# Altium footprint library komponenty_ITS_v1.PcbLib: 81 footprints (part 4 of 6)
Each footprint in its own frame and in the unit in brackets; x right, y up, seen from the top. Pads: shape width x height; smd on the part's side, far side on the other; paste and mask are expansions set on the pad; w line width, h text height; cw(c..) or ccw(c..) is an arc to the next point about the centre after c.
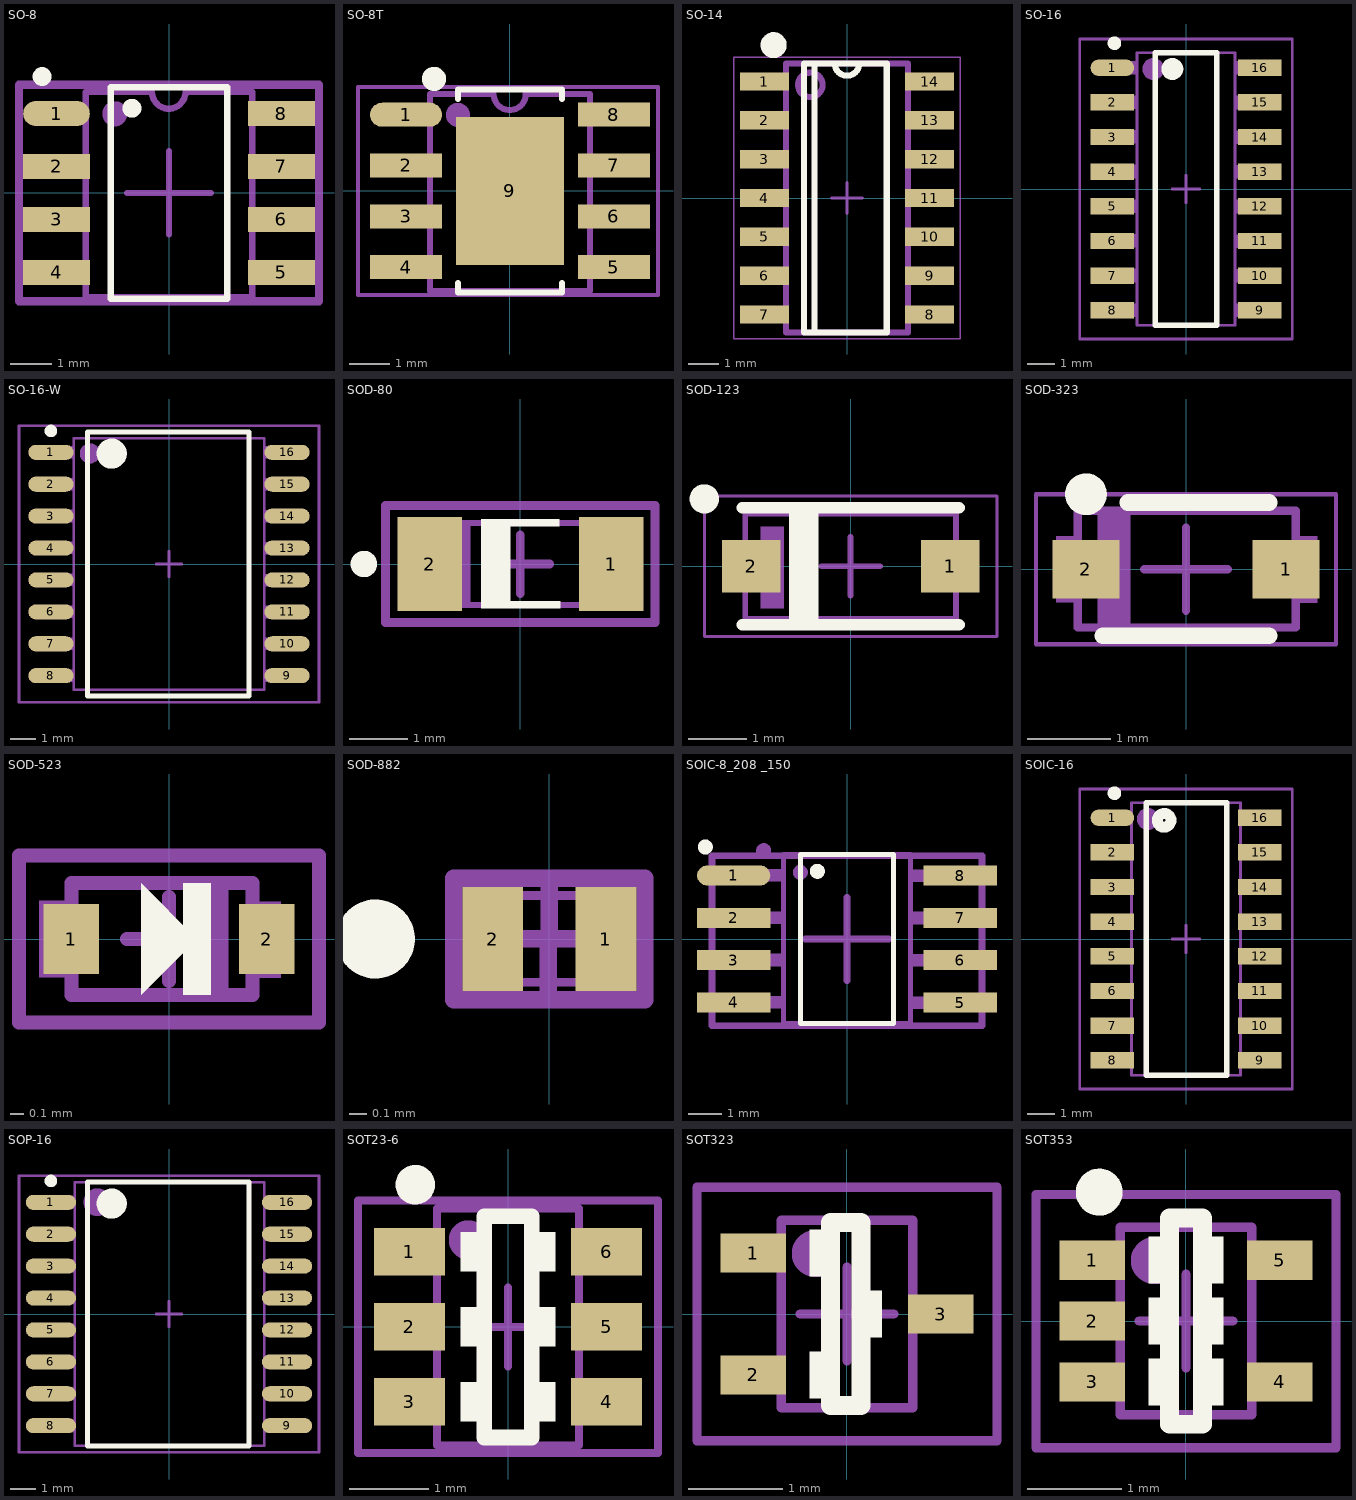
[diagram p3: the footprints below, top view; thin cyan lines are the x and y axes]

## SO-8 [mm]
pads (8):
  oval 1.6x0.6 smd: 1(-2.7,1.905)
  rect 1.6x0.6 smd: 2(-2.7,0.635) 3(-2.7,-0.635) 4(-2.7,-1.905) 5(2.7,-1.905) 6(2.7,-0.635) 7(2.7,0.635) 8(2.7,1.905)
Top Overlay:
  circle w0.25: c-0.889,2.032 r0.1
  circle w0.25: c-3.048,2.794 r0.1
  lines w0.152: -1.397,-2.54 -1.397,2.54 1.397,2.54 1.397,-2.54 -1.397,-2.54
Top M11-12_SMOT:
  circle w0.3: c-1.3,1.9 r0.15
  rectangle: -2.8,-0.834 -2,-0.433
  rectangle: -2.8,0.433 -2,0.833
  region: 2.8,-0.444 2,-0.444 2,-0.845 2.8,-0.845
  region: 2.8,0.856 2,0.856 2,0.455 2.8,0.455
  rectangle: -2.8,-2.1 -2,-1.699
  rectangle: -2.8,1.644 -2,2.144
  region: 2.8,-1.733 2,-1.733 2,-2.133 2.8,-2.133
  region: 2.8,2.112 2,2.112 2,1.71 2.8,1.71
  lines w0.15: -2,-2.5 -2,2.42 -0.407,2.42 ccw(c-0.007,2.42) 0.393,2.42 2,2.42 2,-2.5 -2,-2.5
Top M13-14_SDES:
  text "'.Designator'" at -5.665,-0.417 h1
M15_orgin:
  lines w0.15: -1,0 0,0 ; 0,-1 0,0 ; 0,1 0,0 ; 1,0 0,0
  lines w0.2: -3.6,-2.6 3.6,-2.6 3.6,2.6 -3.6,2.6 -3.6,-2.6
3D body "SO-8.STEP": height 1.89, standoff -0.01, extent -3.144,-2.515 3.195,2.489

## SO-8T [mm]
pads (9):
  oval 1.8x0.6 smd: 1(-2.6,1.905)
  rect 1.8x0.6 smd: 2(-2.6,0.635) 3(-2.6,-0.635) 4(-2.6,-1.905) 5(2.6,-1.905) 6(2.6,-0.635) 7(2.6,0.635) 8(2.6,1.905)
  rect 2.7x3.7 smd paste-0.2: 9(0,0)
Top Overlay:
  circle w0.4: c-1.9,2.8 r0.1
  lines w0.152: -1.3,-2.3 -1.3,-2.54 1.3,-2.54 1.3,-2.3 ; -1.3,2.3 -1.3,2.54 1.3,2.54 1.3,2.3
Top M11-12_SMOT:
  circle w0.3: c-1.3,1.9 r0.15
  rectangle: -2.8,-0.834 -2,-0.433
  rectangle: -2.8,0.433 -2,0.833
  region: 2.8,-0.444 2,-0.444 2,-0.845 2.8,-0.845
  region: 2.8,0.856 2,0.856 2,0.455 2.8,0.455
  rectangle: -2.8,-2.1 -2,-1.699
  rectangle: -2.8,1.644 -2,2.144
  region: 2.8,-1.733 2,-1.733 2,-2.133 2.8,-2.133
  region: 2.8,2.112 2,2.112 2,1.71 2.8,1.71
  lines w0.15: -2,-2.5 -2,2.42 -0.407,2.42 ccw(c-0.007,2.42) 0.393,2.42 2,2.42 2,-2.5 -2,-2.5
Top M13-14_SDES:
  text "'.Designator'" at -5.665,-0.417 h1
M15_orgin:
  lines w0.1: -1,0 0,0 ; 0,-1 0,0 ; 0,1 0,0 ; 1,0 0,0 ; -3.8,-2.6 -3.8,2.6 3.7,2.6 3.7,-2.6 -3.8,-2.6
3D body "SO-8.STEP": height 1.89, standoff -0.01, extent -3.144,-2.515 3.195,2.489

## SO-14 [mm]
height 1.75
pads (14):
  rect 1.6x0.6 smd: 1(-2.7,3.81) 2(-2.7,2.54) 3(-2.7,1.27) 4(-2.7,0) 5(-2.7,-1.27) 6(-2.7,-2.54) 7(-2.7,-3.81) 8(2.7,-3.81) 9(2.7,-2.54) 10(2.7,-1.27) 11(2.7,0) 12(2.7,1.27) 13(2.7,2.54) 14(2.7,3.81)
Top Overlay:
  circle w0.45: c-2.4,5 r0.2
  lines w0.2: -1.062,-4.4 -1.062,4.4 ; -0.4,4.4 ccw(c0,4.4) 0.4,4.4 ; -1.4,-4.4 1.3,-4.4 1.3,4.4 -1.4,4.4 -1.4,-4.4
Top M11-12_SMOT:
  circle w0.2: c-1.2,3.7 r0.4
  region: 3,4.02 2,4.02 2,3.606 3,3.606
  region: 3,2.75 2,2.75 2,2.336 3,2.336
  region: 3,1.48 2,1.48 2,1.066 3,1.066
  region: 3,0.21 2,0.21 2,-0.204 3,-0.204
  region: 3,-1.06 2,-1.06 2,-1.474 3,-1.474
  region: 3,-2.33 2,-2.33 2,-2.744 3,-2.744
  region: 3,-2.33 2,-2.33 2,-2.744 3,-2.744
  region: 3,-3.6 2,-3.6 2,-4.014 3,-4.014
  rectangle: -3,-4.02 -2,-3.606
  rectangle: -3,-2.75 -2,-2.336
  rectangle: -3,-1.48 -2,-1.066
  rectangle: -3,-0.21 -2,0.204
  rectangle: -3,1.06 -2,1.474
  rectangle: -3,2.33 -2,2.744
  rectangle: -3,3.6 -2,4.014
  lines w0.2: -2,-4.4 2,-4.4 2,4.4 -2,4.4 -2,-4.4
Top M13-14_SDES:
  text "'.Designator'" at 0.417,-5.665 h1
M15_orgin:
  lines w0.05: -3.7,-4.6 3.7,-4.6 3.7,4.6 -3.7,4.6 -3.7,-4.6
  lines w0.1: -0.5,0 0.5,0 ; 0,-0.5 0,0.5
3D body "SO-14.step": height 1.61, standoff 0.01, extent -2.995,-4.345 2.995,4.345

## SO-16 [mm] "SOIC, 16-Leads, Body 10,0x4,0mm (max), Pitch 1,27mm, IPC Low Density"
height 1.75
pads (16):
  oval 1.6x0.6 smd: 1(-2.7,4.445)
  rect 1.6x0.6 smd: 2(-2.7,3.175) 3(-2.7,1.905) 4(-2.7,0.635) 5(-2.7,-0.635) 6(-2.7,-1.905) 7(-2.7,-3.175) 8(-2.7,-4.445) 9(2.7,-4.445) 10(2.7,-3.175) 11(2.7,-1.905) 12(2.7,-0.635) 13(2.7,0.635) 14(2.7,1.905) 15(2.7,3.175) 16(2.7,4.445)
Top Overlay:
  circle w0.4: c-0.5,4.4 r0.2
  circle w0.25: c-2.625,5.345 r0.125
  lines w0.2: -1.125,-5 1.125,-5 1.125,5 -1.125,5 -1.125,-5
Top M11-12_SMOT:
  circle w0.4: c-1.2,4.4 r0.2
  rectangle: -2.9,-4.69 -1.8,-4.19
  rectangle: -2.9,-3.42 -1.8,-2.92
  rectangle: -2.9,-0.88 -1.8,-0.38
  rectangle: -2.9,0.39 -1.8,0.89
  rectangle: -2.9,2.93 -1.8,3.43
  rectangle: -2.9,4.2 -1.8,4.7
  region: 2.9,-4.2 1.8,-4.2 1.8,-4.7 2.9,-4.7
  region: 2.9,-2.93 1.8,-2.93 1.8,-3.43 2.9,-3.43
  region: 2.9,-0.39 1.8,-0.39 1.8,-0.89 2.9,-0.89
  region: 2.9,0.88 1.8,0.88 1.8,0.38 2.9,0.38
  region: 2.9,3.42 1.8,3.42 1.8,2.92 2.9,2.92
  region: 2.9,4.69 1.8,4.69 1.8,4.19 2.9,4.19
  rectangle: -2.9,-2.15 -1.8,-1.65
  rectangle: -2.9,1.66 -1.8,2.16
  region: 2.9,-1.66 1.8,-1.66 1.8,-2.16 2.9,-2.16
  region: 2.9,2.15 1.8,2.15 1.8,1.65 2.9,1.65
  lines w0.1: -1.8,-5 -1.8,5 1.8,5 1.8,-5 -1.8,-5
Top M13-14_SDES:
  text "'.Designator'" at 0.333,-4.532 h0.8
M15_orgin:
  lines w0.1: -0.5,0 0.5,0 ; 0,-0.5 0,0.5 ; -3.9,-5.5 3.9,-5.5 3.9,5.5 -3.9,5.5 -3.9,-5.5
3D body "SO-16.step": height 1.45, standoff 0, extent -2.857,-4.991 3.048,4.991

## SO-16-W [mm]
height 2
pads (16):
  oval 1.8x0.6 smd: 1(-4.7,4.445) 2(-4.7,3.175) 3(-4.7,1.905) 4(-4.7,0.635) 5(-4.7,-0.635) 6(-4.7,-1.905) 7(-4.7,-3.175) 8(-4.7,-4.445) 9(4.7,-4.445) 10(4.7,-3.175) 11(4.7,-1.905) 12(4.7,-0.635) 13(4.7,0.635) 14(4.7,1.905) 15(4.7,3.175) 16(4.7,4.445)
Top Overlay:
  circle w0.6: c-2.281,4.394 r0.3
  circle w0.25: c-4.7,5.295 r0.125
  lines w0.2: -3.251,-5.25 3.175,-5.25 3.175,5.25 -3.251,5.25 -3.251,-5.25
Top M11-12_SMOT:
  circle w0.4: c-3.15,4.4 r0.2
  rectangle: -4.9,-4.69 -3.8,-4.19
  rectangle: -4.9,-3.42 -3.8,-2.92
  rectangle: -4.9,-0.88 -3.8,-0.38
  rectangle: -4.9,0.39 -3.8,0.89
  rectangle: -4.9,2.93 -3.8,3.43
  rectangle: -4.9,4.2 -3.8,4.7
  region: 4.9,-4.2 3.8,-4.2 3.8,-4.7 4.9,-4.7
  region: 4.9,-2.93 3.8,-2.93 3.8,-3.43 4.9,-3.43
  region: 4.9,-0.39 3.8,-0.39 3.8,-0.89 4.9,-0.89
  region: 4.9,0.88 3.8,0.88 3.8,0.38 4.9,0.38
  region: 4.9,3.42 3.8,3.42 3.8,2.92 4.9,2.92
  region: 4.9,4.69 3.8,4.69 3.8,4.19 4.9,4.19
  rectangle: -4.9,-2.15 -3.8,-1.65
  rectangle: -4.9,1.66 -3.8,2.16
  region: 4.9,-1.66 3.8,-1.66 3.8,-2.16 4.9,-2.16
  region: 4.9,2.15 3.8,2.15 3.8,1.65 4.9,1.65
  lines w0.1: -3.8,-5 -3.8,5 3.8,5 3.8,-5 -3.8,-5
Top M13-14_SDES:
  text "'.Designator'" at 0.367,-5.665 h1
M15_orgin:
  lines w0.1: -0.5,0 0.5,0 ; 0,-0.5 0,0.5 ; -5.969,-5.5 5.969,-5.5 5.969,5.5 -5.969,5.5 -5.969,-5.5
3D body "so16w.step": height 3.5, standoff 0, extent -5.15,-5.171 5.15,5.029

## SOD-80 [mm] "miniMELF"
pads (2):
  rect 1.1x1.6 smd: 1(1.55,0) 2(-1.54,0)
Top Overlay:
  circle w0.25: c-2.667,0 r0.1
  rectangle: -0.518,-0.76 0.69,-0.633
  rectangle: -0.538,0.642 0.67,0.769
  rectangle: -0.672,-0.758 -0.164,0.766
Top M11-12_SMOT:
  region: 1.787,0.676 1.506,0.676 1.506,-0.758 1.787,-0.758
  region: -0.848,0.687 -1.248,0.687 -1.248,-0.713 -0.848,-0.713
  rectangle: -1.781,-0.7 -1.5,0.733
  lines w0.1: -1.77,-0.7 1.8,-0.7 1.8,0.7 -1.77,0.7 -1.77,-0.7
Top M13-14_SDES:
  text "'.Designator'" at -3.565,-0.292 h0.7
M15_orgin:
  lines w0.15: -0.5,0 0,0 0,0.5 ; -0.001,-0.001 0.499,-0.001 ; 0,-0.501 0,-0.001 ; -2.3,-1 2.3,-1 2.3,1 -2.3,1 -2.3,-1
3D body "minimelf.step": height 1.4, standoff 0, extent -1.725,-0.686 1.775,0.714

## SOD-123 [mm] "SOD-123"
height 1.4
pads (2):
  rect 1x0.9 smd: 1(1.7,0) 2(-1.7,0)
Top Overlay:
  circle w0.25: c-2.5,1.15 r0.125
  rectangle: -1.05,-1 -0.55,1
  lines w0.2: -1.85,-1 1.85,-1 ; -1.85,1 1.85,1
Top M11-12_SMOT:
  region: 2.15,0.4 1.75,0.4 1.75,-0.405 2.15,-0.405
  rectangle: -2.1,-0.4 -1.8,0.4
  rectangle: -1.539,-0.723 -1.139,0.675
  lines w0.1: -1.8,-0.9 1.8,-0.9 1.8,0.9 -1.8,0.9 -1.8,-0.9
Top M13-14_SDES:
  text "'.Designator'" at -4.065,-0.192 h0.7
M15_orgin:
  lines w0.05: -2.5,-1.2 -2.5,1.2 2.5,1.2 2.5,-1.2 -2.5,-1.2
  lines w0.1: -0.5,0 0.5,0 ; 0,-0.5 0,0.5
3D body "SOD-123FL CASE 498.step": height 0.96, standoff 0.01, extent -1.8,-0.825 1.8,0.825

## SOD-323 [mm] "SOD-323"
height 1.4
pads (2):
  rect 0.8x0.7 smd: 1(1.2,0) 2(-1.2,0)
Top Overlay:
  circle w0.25: c-1.2,0.9 r0.125
  lines w0.2: -1,-0.8 1,-0.8 ; -0.7,0.8 1,0.8
Top M11-12_SMOT:
  region: 1.577,0.4 1.318,0.4 1.318,-0.405 1.577,-0.405
  rectangle: -1.558,-0.402 -1.3,0.398
  rectangle: -1.065,-0.712 -0.665,0.686
  lines w0.1: -1.3,-0.7 1.318,-0.7 1.318,0.7 -1.3,0.7 -1.3,-0.7
Top M13-14_SDES:
  text "'.Designator'" at -2.632,-0.208 h0.5
M15_orgin:
  lines w0.05: -1.8,-0.9 1.8,-0.9 1.8,0.9 -1.8,0.9 -1.8,-0.9
  lines w0.1: -0.5,0 0.5,0 ; 0,-0.5 0,0.5
3D body "SOD323-1.step": height 1.11, standoff 0.01, extent -1.3,-0.675 1.3,0.675

## SOD-523 [mm] "SC-79"
pads (2):
  rect 0.4x0.5 smd: 1(-0.7,0) 2(0.7,0)
Top Overlay:
  rectangle: 0.1,-0.4 0.3,0.4
  region: 0.2,0 -0.2,0.4 -0.2,-0.4
Top M11-12_SMOT:
  region: 0.802,0.27 0.623,0.27 0.623,-0.279 0.802,-0.279
  region: 0.425,0.4 0.2,0.4 0.2,-0.4 0.425,-0.4
  rectangle: -0.932,-0.275 -0.707,0.278
  lines w0.1: -0.7,-0.4 0.6,-0.4 0.6,0.4 -0.7,0.4 -0.7,-0.4
Top M13-14_SDES:
  text "'.Designator'" at -2.316,0.733 h0.4
M15_orgin:
  lines w0.1: -0.3,0 0,0 ; 0,-0.3 0,0 ; 0,0.3 0,0 ; 0.3,0 0,0 ; -1.075,-0.6 1.075,-0.6 1.075,0.6 -1.075,0.6 -1.075,-0.6
3D body "SOD523-1.step": height 0.71, standoff 0.01, extent -0.8,-0.399 0.8,0.399

## SOD-882 [mm]
pads (2):
  rect 0.35x0.6 smd: 1(0.325,0) 2(-0.325,0)
Top Overlay:
  circle w0.254: c-1,0 r0.1
Top M11-12_SMOT:
  rectangle: -0.474,-0.25 -0.374,0.25
  rectangle: -0.3,-0.25 -0.2,0.25
  rectangle: 0.35,-0.25 0.45,0.25
  lines w0.05: -0.45,-0.249 0.427,-0.249 ; -0.45,0.25 0.425,0.25
Top M13-14_SDES:
  text "'.Designator'" at -2.316,0.633 h0.4
M15_orgin:
  lines w0.1: -0.304,0.001 -0.004,0.001 ; -0.005,-0.299 -0.005,0.001 0.295,0.001 ; 0,0 0,0.3 ; -0.55,-0.35 0.55,-0.35 0.55,0.35 -0.55,0.35 -0.55,-0.35
3D body: height 2, standoff 0, extent -0.5,-0.299 0.5,0.3

## SOIC-8_208 _150 [mm] "150 - 208mm soic 8 package FLASH"
pads (8):
  oval 2.2x0.6 smd: 1(-3.4,1.905)
  rect 2.2x0.6 smd: 2(-3.4,0.635) 3(-3.4,-0.635) 4(-3.4,-1.905) 5(3.4,-1.905) 6(3.4,-0.635) 7(3.4,0.635) 8(3.4,1.905)
Top Overlay:
  circle w0.25: c-4.252,2.76 r0.1
  circle w0.25: c-0.889,2.032 r0.1
  lines w0.152: -1.397,-2.54 1.397,-2.54 1.397,2.54 -1.397,2.54 -1.397,-2.54
Top M11-12_SMOT:
  circle w0.25: c-1.4,2 r0.1
  circle w0.25: c-2.5,2.65 r0.1
  region: 3.6,2.092 1.9,2.092 1.9,1.71 3.6,1.71
  region: 3.6,-1.718 1.9,-1.718 1.9,-2.1 3.6,-2.1
  rectangle: -3.6,1.718 -1.9,2.1
  rectangle: -3.6,-2.092 -1.9,-1.71
  region: 3.6,0.822 1.9,0.822 1.9,0.44 3.6,0.44
  region: 3.6,-0.448 1.9,-0.448 1.9,-0.83 3.6,-0.83
  rectangle: -3.6,0.448 -1.9,0.83
  rectangle: -3.6,-0.822 -1.9,-0.44
  lines w0.152: -0.64,2.54 0.576,2.54 1.9,2.54 1.9,-2.54 -1.9,-2.54 -1.9,2.54 -0.64,2.54 ; -0.64,2.54 -0.64,2.54
Top M13-14_SDES:
  text "'.Designator'" at -6.798,-0.5 h1.2
M15_orgin:
  lines w0.2: -1.25,0 0,0 ; 0,-1.25 0,0 ; 0,1.25 0,0 ; 1.25,0 0,0 ; -4.05,-2.6 4.05,-2.6 4.05,2.5 -4.05,2.5 -4.05,-2.6
3D body "SO-8.STEP": height 1.89, standoff -0.01, extent -3.144,-2.515 3.195,2.489

## SOIC-16 [mm] "SOIC, 16-Leads, Body 10,0x4,0mm (max), Pitch 1,27mm, IPC Low Density"
height 1.75
pads (16):
  oval 1.6x0.6 smd: 1(-2.7,4.445)
  rect 1.6x0.6 smd: 2(-2.7,3.175) 3(-2.7,1.905) 4(-2.7,0.635) 5(-2.7,-0.635) 6(-2.7,-1.905) 7(-2.7,-3.175) 8(-2.7,-4.445) 9(2.7,-4.445) 10(2.7,-3.175) 11(2.7,-1.905) 12(2.7,-0.635) 13(2.7,0.635) 14(2.7,1.905) 15(2.7,3.175) 16(2.7,4.445)
Top Overlay:
  circle w0.25: c-2.625,5.345 r0.125
  circle w0.4: c-0.8,4.35 r0.25
  lines w0.2: -1.45,-5 -1.45,5 1.5,5 1.5,-5 -1.45,-5
Top M11-12_SMOT:
  circle w0.4: c-1.4,4.4 r0.2
  region: 2.85,2.1 2,2.1 2,1.7 2.85,1.7
  region: 2.85,-1.71 2,-1.71 2,-2.11 2.85,-2.11
  rectangle: -2.85,1.71 -2,2.11
  rectangle: -2.85,-2.1 -2,-1.7
  region: 2.85,4.64 2,4.64 2,4.24 2.85,4.24
  region: 2.85,3.37 2,3.37 2,2.97 2.85,2.97
  region: 2.85,0.83 2,0.83 2,0.43 2.85,0.43
  region: 2.85,-0.44 2,-0.44 2,-0.84 2.85,-0.84
  region: 2.85,-2.98 2,-2.98 2,-3.38 2.85,-3.38
  region: 2.85,-4.25 2,-4.25 2,-4.65 2.85,-4.65
  rectangle: -2.85,4.25 -2,4.65
  rectangle: -2.85,2.98 -2,3.38
  rectangle: -2.85,0.44 -2,0.84
  rectangle: -2.85,-0.83 -2,-0.43
  rectangle: -2.85,-3.37 -2,-2.97
  rectangle: -2.85,-4.64 -2,-4.24
  lines w0.1: -2,-5 2,-5 2,5 -2,5 -2,-5
Top M13-14_SDES:
  text "'.Designator'" at 0.5,-6.798 h1.2
M15_orgin:
  lines w0.1: -0.5,0 0.5,0 ; 0,-0.5 0,0.5 ; -3.9,-5.5 -3.9,5.5 3.9,5.5 3.9,-5.5 -3.9,-5.5
3D body "SO-16.step": height 1.45, standoff 0, extent -2.857,-4.991 3.048,4.991

## SOP-16 [mm]
height 2
pads (16):
  oval 2x0.6 smd: 1(-4.7,4.445) 2(-4.7,3.175) 3(-4.7,1.905) 4(-4.7,0.635) 5(-4.7,-0.635) 6(-4.7,-1.905) 7(-4.7,-3.175) 8(-4.7,-4.445) 9(4.7,-4.445) 10(4.7,-3.175) 11(4.7,-1.905) 12(4.7,-0.635) 13(4.7,0.635) 14(4.7,1.905) 15(4.7,3.175) 16(4.7,4.445)
Top Overlay:
  circle w0.25: c-4.7,5.295 r0.125
  circle w0.6: c-2.281,4.394 r0.3
  lines w0.2: -3.251,-5.25 -3.251,5.25 3.175,5.25 3.175,-5.25 -3.251,-5.25
Top M11-12_SMOT:
  circle w0.6: c-2.85,4.45 r0.25
  rectangle: -5,-4.69 -3.75,-4.19
  rectangle: -5,-3.42 -3.75,-2.92
  rectangle: -5,-0.88 -3.75,-0.38
  rectangle: -5,0.39 -3.75,0.89
  rectangle: -5,2.93 -3.75,3.43
  rectangle: -5,4.2 -3.75,4.7
  region: 5,-4.2 3.75,-4.2 3.75,-4.7 5,-4.7
  region: 5,-2.93 3.75,-2.93 3.75,-3.43 5,-3.43
  region: 5,-0.39 3.75,-0.39 3.75,-0.89 5,-0.89
  region: 5,0.88 3.75,0.88 3.75,0.38 5,0.38
  region: 5,3.42 3.75,3.42 3.75,2.92 5,2.92
  region: 5,4.69 3.75,4.69 3.75,4.19 5,4.19
  rectangle: -5,-2.15 -3.75,-1.65
  rectangle: -5,1.66 -3.75,2.16
  region: 5,-1.66 3.75,-1.66 3.75,-2.16 5,-2.16
  region: 5,2.15 3.75,2.15 3.75,1.65 5,1.65
  lines w0.1: -3.75,-5.25 -3.75,5.25 3.8,5.25 3.8,-5.25 -3.75,-5.25
Top M13-14_SDES:
  text "'.Designator'" at 0.5,-6.798 h1.2
M15_orgin:
  lines w0.1: -0.5,0 0.5,0 ; 0,-0.5 0,0.5 ; -5.969,-5.5 -5.969,5.5 5.969,5.5 5.969,-5.5 -5.969,-5.5
3D body "so16w.step": height 3.5, standoff 0, extent -5.15,-5.171 5.15,5.029

## SOT23-6 [mm] "Zetex"
height 1.45
pads (6):
  rect 0.9x0.6 smd: 1(-1.25,0.95) 2(-1.25,0) 3(-1.25,-0.95) 4(1.25,-0.95) 5(1.25,0) 6(1.25,0.95)
Top Overlay:
  circle w0.25: c-1.175,1.8 r0.125
  region: 0.6,1.2 0.2,1.2 0.2,0.7 0.6,0.7
  region: 0.6,0.25 0.2,0.25 0.2,-0.25 0.6,-0.25
  region: 0.6,-0.7 0.2,-0.7 0.2,-1.2 0.6,-1.2
  rectangle: -0.6,-1.2 -0.2,-0.7
  rectangle: -0.6,-0.25 -0.2,0.25
  rectangle: -0.6,0.7 -0.2,1.2
  lines w0.2: -0.3,-1.4 0.3,-1.4 0.3,1.4 -0.3,1.4 -0.3,-1.4
Top M11-12_SMOT:
  circle w0.3: c-0.5,1.1 r0.1
  rectangle: -1.5,-1.2 -0.9,-0.7
  rectangle: -1.5,0.7 -0.9,1.2
  region: 1.5,-0.7 0.9,-0.7 0.9,-1.2 1.5,-1.2
  region: 1.5,1.2 0.9,1.2 0.9,0.7 1.5,0.7
  rectangle: -1.5,-0.25 -0.9,0.25
  region: 1.5,0.25 0.9,0.25 0.9,-0.25 1.5,-0.25
  lines w0.1: -0.9,-1.5 -0.9,1.5 0.9,1.5 0.9,-1.5 -0.9,-1.5
Top M13-14_SDES:
  text "'.Designator'" at 0.292,-4.265 h0.7
M15_orgin:
  lines w0.1: -0.5,0 0.5,0 ; 0,-0.5 0,0.5 ; -1.9,-1.6 -1.9,1.6 1.9,1.6 1.9,-1.6 -1.9,-1.6
3D body "SOT23-6.STEP": height 1.3, standoff 0, extent -1.448,-1.499 1.552,1.501

## SOT323 [mm]
height 1.1
pads (3):
  rect 0.7x0.42 smd: 1(-1,0.65) 2(-1,-0.65) 3(1,0)
Top Overlay:
  rectangle: 0.2,-0.25 0.375,0.25
  rectangle: -0.4,0.4 -0.15,0.9
  rectangle: -0.4,-0.9 -0.15,-0.4
  lines w0.2: -0.175,-0.975 -0.175,0.975 0.15,0.975 0.15,-0.975 -0.175,-0.975
Top M11-12_SMOT:
  circle w0.3: c-0.339,0.645 r0.1
  rectangle: -1.138,-0.8 -0.7,-0.489
  rectangle: -1.138,0.5 -0.7,0.811
  region: 1.138,0.15 0.7,0.15 0.7,-0.161 1.138,-0.161
  lines w0.1: -0.7,-1 -0.7,1 0.7,1 0.7,-1 -0.7,-1
Top M13-14_SDES:
  text "'.Designator'" at 0.25,-3.599 h0.6
M15_orgin:
  lines w0.1: -0.5,0 0.5,0 ; 0,-0.5 0,0.5 ; -1.6,-1.35 1.6,-1.35 1.6,1.35 -1.6,1.35 -1.6,-1.35
3D body "SOT323_SC70-3_.STEP": height 1.11, standoff 0.01, extent -1.122,-1.1 1.123,1.1

## SOT353 [mm]
height 1.1
pads (5):
  rect 0.7x0.42 smd: 1(-1,0.65) 2(-1,0) 3(-1,-0.65) 4(1,-0.65) 5(1,0.65)
Top Overlay:
  circle w0.25: c-0.925,1.375 r0.125
  rectangle: -0.4,0.4 -0.15,0.9
  rectangle: -0.4,-0.25 -0.15,0.25
  rectangle: -0.4,-0.9 -0.15,-0.4
  region: 0.4,0.9 0.15,0.9 0.15,0.4 0.4,0.4
  region: 0.4,0.25 0.15,0.25 0.15,-0.25 0.4,-0.25
  region: 0.4,-0.4 0.15,-0.4 0.15,-0.9 0.4,-0.9
  lines w0.2: -0.175,-1.1 0.175,-1.1 0.175,1.1 -0.175,1.1 -0.175,-1.1
Top M11-12_SMOT:
  circle w0.3: c-0.339,0.645 r0.1
  rectangle: -1.138,-0.8 -0.7,-0.489
  rectangle: -1.138,0.5 -0.7,0.811
  region: 1.138,-0.5 0.7,-0.5 0.7,-0.811 1.138,-0.811
  region: 1.138,0.8 0.7,0.8 0.7,0.489 1.138,0.489
  rectangle: -1.138,-0.15 -0.7,0.161
  lines w0.1: -0.7,-1 -0.7,1 0.7,1 0.7,-1 -0.7,-1
Top M13-14_SDES:
  text "'.Designator'" at 0.25,-3.699 h0.6
M15_orgin:
  lines w0.1: -0.5,0 0.5,0 ; 0,-0.5 0,0.5 ; -1.6,-1.35 -1.6,1.35 1.6,1.35 1.6,-1.35 -1.6,-1.35
3D body "SC70-5-1.step": height 0.95, standoff 0, extent -1.05,-1 1.05,1